# Altium schematic symbol library Capacitor - Ceramic - Sumsung.SchLib: 1421 symbols (part 4 of 8) (continued)
## CL21B103JBANNNC (continued)
CAP CER 10000PF 50V X7R 0805; Part Number: CL21B103JBANNNC; Manufacturer: Samsung Electro-Mechanics America, Inc.; TemperatureRange: -55C ~ 125C; Tolerance: 5%; Value: 10000pF; PartId: 14087; Supplier 1: Digi-Key; Supplier Part Number 1: 1276-1245-2-ND; ComponentLink1Description: Datasheet; ComponentLink1URL: http://www.samsungsem.com/kr/support/product-search/mlcc/CL21B103JBANNNC.jsp; ComponentLink2Description: Digi-Key Listing; ComponentLink2URL: https://www.digikey.com/product-detail/en/samsung-electro-mechanics-america-inc/CL21B103JBANNNC/1276-1245-2-ND/3886903; TemperatureCoefficient: X7R; Voltage: 50V; Price: 0.0151; Device Package: 0805 (2012 Metric)
footprint CAP 0805/2012
pins: 1, 2

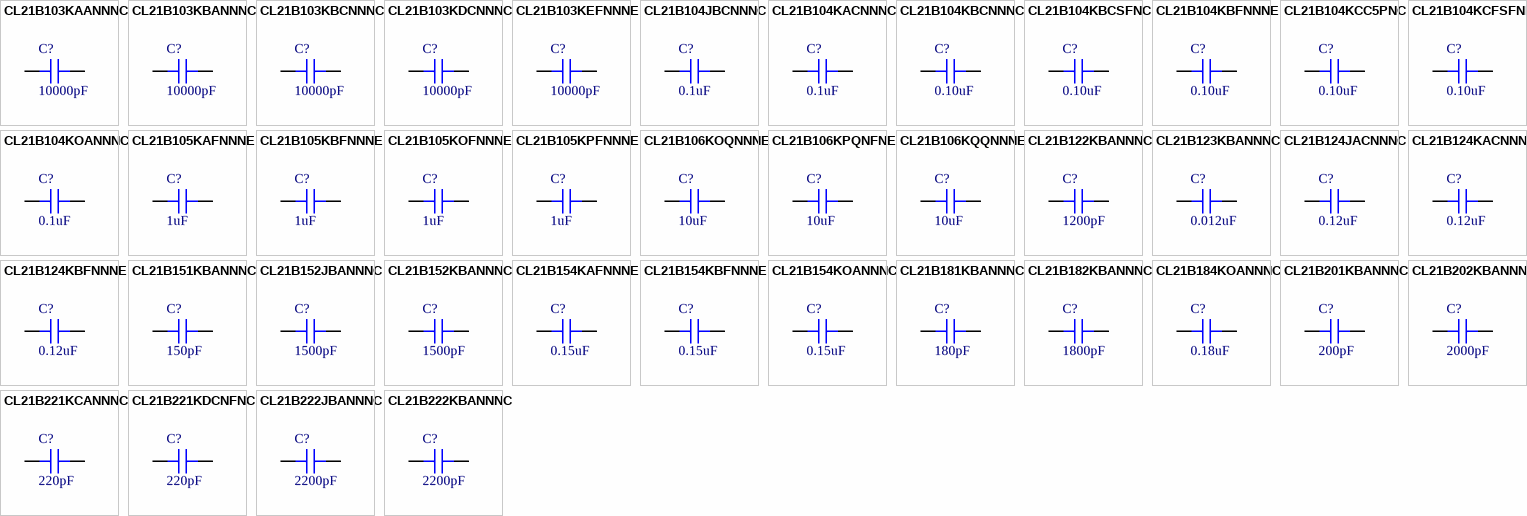
[diagram p18: symbols CL21B103KAANNNC to CL21B222KBANNNC]

## CL21B103KAANNNC
designator C?, comment 10000pF
CAP CER 10000PF 25V X7R 0805; Part Number: CL21B103KAANNNC; Manufacturer: Samsung Electro-Mechanics America, Inc.; TemperatureRange: -55C ~ 125C; Tolerance: 10%; Value: 10000pF; PartId: 5695; Supplier 1: Digi-Key; Supplier Part Number 1: 1276-2434-2-ND; ComponentLink1Description: Datasheet; ComponentLink1URL: http://www.samsungsem.com/kr/support/product-search/mlcc/CL21B103KAANNNC.jsp; ComponentLink2Description: Digi-Key listing; ComponentLink2URL: http://digikey.com/product-detail/en/CL21B103KAANNNC/1276-2434-2-ND/3888092; TemperatureCoefficient: X7R; Voltage: 25V; Price: 0.0081; Type: -; Device Package: 0805 (2012 Metric)
footprint CAP 0805/2012
pins: 1, 2

## CL21B103KBANNNC
designator C?, comment 10000pF
CAP CER 10000PF 50V X7R 0805; Part Number: CL21B103KBANNNC; Manufacturer: Samsung Electro-Mechanics America, Inc.; TemperatureRange: -55C ~ 125C; Tolerance: 10%; Value: 10000pF; PartId: 13759; Supplier 1: Digi-Key; Supplier Part Number 1: 1276-1015-2-ND; ComponentLink1Description: Datasheet; ComponentLink1URL: http://www.samsungsem.com/kr/support/product-search/mlcc/CL21B103KBANNNC.jsp; ComponentLink2Description: Digi-Key Listing; ComponentLink2URL: https://www.digikey.com/product-detail/en/samsung-electro-mechanics-america-inc/CL21B103KBANNNC/1276-1015-2-ND/3886673; TemperatureCoefficient: X7R; Voltage: 50V; Price: 0.0056; Device Package: 0805 (2012 Metric)
footprint CAP 0805/2012
pins: 1, 2

## CL21B103KBCNNNC
designator C?, comment 10000pF
CAP CER 10000PF 50V X7R 0805; Part Number: CL21B103KBCNNNC; Manufacturer: Samsung Electro-Mechanics America, Inc.; TemperatureRange: -55C ~ 125C; Tolerance: 10%; Value: 10000pF; PartId: 13919; Supplier 1: Digi-Key; Supplier Part Number 1: 1276-1078-2-ND; ComponentLink1Description: Datasheet; ComponentLink1URL: http://www.samsungsem.com/kr/support/product-search/mlcc/CL21B103KBCNNNC.jsp; ComponentLink2Description: Digi-Key Listing; ComponentLink2URL: https://www.digikey.com/product-detail/en/samsung-electro-mechanics-america-inc/CL21B103KBCNNNC/1276-1078-2-ND/3886736; TemperatureCoefficient: X7R; Voltage: 50V; Price: 0.0056; Device Package: 0805 (2012 Metric)
footprint CAP 0805/2012
pins: 1, 2

## CL21B103KDCNNNC
designator C?, comment 10000pF
CAP CER 10000PF 200V X7R 0805; Part Number: CL21B103KDCNNNC; Manufacturer: Samsung Electro-Mechanics America, Inc.; TemperatureRange: -55C ~ 125C; Tolerance: 10%; Value: 10000pF; PartId: 5868; Supplier 1: Digi-Key; Supplier Part Number 1: 1276-1170-2-ND; ComponentLink1Description: Datasheet; ComponentLink1URL: http://www.samsungsem.com/global/front/downloadcms.do?path=%2F%2Fglobal%2F%2Fsupport%2F%2Flibrary%2F%2Fproduct-catalog%2F%2F__icsFiles%2F%2Fafieldfile%2F%2F2015%2F%2F11%2F%2F18&fileName=MLCC_1.pdf; ComponentLink2Description: Digi-Key listing; ComponentLink2URL: http://digikey.com/product-detail/en/CL21B103KDCNNNC/1276-1170-2-ND/3886828; TemperatureCoefficient: X7R; Voltage: 200V; Price: 0.0286; Type: -; Device Package: 0805 (2012 Metric)
footprint CAP 0805/2012
pins: 1, 2

## CL21B103KEFNNNE
designator C?, comment 10000pF
CAP CER 10000PF 250V X7R 0805; Part Number: CL21B103KEFNNNE; Manufacturer: Samsung Electro-Mechanics America, Inc.; TemperatureRange: -55C ~ 125C; Tolerance: 10%; Value: 10000pF; PartId: 5912; Supplier 1: Digi-Key; Supplier Part Number 1: 1276-2921-2-ND; ComponentLink1Description: Datasheet; ComponentLink1URL: http://media.digikey.com/pdf/Data%20Sheets/Samsung%20PDFs/CL21B103KEFNNNE_Spec.pdf; ComponentLink2Description: Digi-Key listing; ComponentLink2URL: http://digikey.com/product-detail/en/CL21B103KEFNNNE/1276-2921-2-ND/3888579; TemperatureCoefficient: X7R; Voltage: 250V; Price: 0.0371; Type: -; Device Package: 0805 (2012 Metric)
footprint CAP 0805/2012
pins: 1, 2

## CL21B104JBCNNNC
designator C?, comment 0.1uF
CAP CER 0.1UF 50V X7R 0805; Part Number: CL21B104JBCNNNC; Manufacturer: Samsung Electro-Mechanics America, Inc.; TemperatureRange: -55C ~ 125C; Tolerance: 5%; Value: 0.1uF; PartId: 5847; Supplier 1: Digi-Key; Supplier Part Number 1: 1276-1090-2-ND; ComponentLink1Description: Datasheet; ComponentLink1URL: http://www.samsungsem.com/kr/support/product-search/mlcc/CL21B104JBCNNNC.jsp; ComponentLink2Description: Digi-Key listing; ComponentLink2URL: http://digikey.com/product-detail/en/CL21B104JBCNNNC/1276-1090-2-ND/3886748; TemperatureCoefficient: X7R; Voltage: 50V; Price: 0.0245; Type: -; Device Package: 0805 (2012 Metric)
footprint CAP 0805/2012
pins: 1, 2

## CL21B104KACNNNC
designator C?, comment 0.1uF
CAP CER 0.1UF 25V X7R 0805; Part Number: CL21B104KACNNNC; Manufacturer: Samsung Electro-Mechanics America, Inc.; TemperatureRange: -55C ~ 125C; Tolerance: 10%; Value: 0.1uF; PartId: 5699; Supplier 1: Digi-Key; Supplier Part Number 1: 1276-1099-2-ND; ComponentLink1Description: Datasheet; ComponentLink1URL: http://www.samsungsem.com/kr/support/product-search/mlcc/CL21B104KACNNNC.jsp; ComponentLink2Description: Digi-Key listing; ComponentLink2URL: http://digikey.com/product-detail/en/CL21B104KACNNNC/1276-1099-2-ND/3886757; TemperatureCoefficient: X7R; Voltage: 25V; Price: 0.0099; Type: -; Device Package: 0805 (2012 Metric)
footprint CAP 0805/2012
pins: 1, 2

## CL21B104KBCNNNC
designator C?, comment 0.10uF
CAP CER 0.1UF 50V X7R 0805; Part Number: CL21B104KBCNNNC; Manufacturer: Samsung Electro-Mechanics America, Inc.; TemperatureRange: -55C ~ 125C; Tolerance: 10%; Value: 0.10uF; PartId: 13700; Supplier 1: Digi-Key; Supplier Part Number 1: 1276-1003-2-ND; ComponentLink1Description: Datasheet; ComponentLink1URL: http://www.samsungsem.com/kr/support/product-search/mlcc/CL21B104KBCNNNC.jsp; ComponentLink2Description: Digi-Key Listing; ComponentLink2URL: https://www.digikey.com/product-detail/en/samsung-electro-mechanics-america-inc/CL21B104KBCNNNC/1276-1003-2-ND/3886661; TemperatureCoefficient: X7R; Voltage: 50V; Price: 0.0092; Device Package: 0805 (2012 Metric)
footprint CAP 0805/2012
pins: 1, 2

## CL21B104KBCSFNC
designator C?, comment 0.10uF
CAP CER 0.1UF 50V X7R 0805; Part Number: CL21B104KBCSFNC; Manufacturer: Samsung Electro-Mechanics America, Inc.; TemperatureRange: -55C ~ 125C; Tolerance: 10%; Value: 0.10uF; PartId: 13972; Supplier 1: Digi-Key; Supplier Part Number 1: 1276-2446-2-ND; ComponentLink1Description: Datasheet; ComponentLink1URL: http://www.samsungsem.com/kr/support/product-search/mlcc/CL21B104KBCSFNC.jsp; ComponentLink2Description: Digi-Key Listing; ComponentLink2URL: https://www.digikey.com/product-detail/en/samsung-electro-mechanics-america-inc/CL21B104KBCSFNC/1276-2446-2-ND/3888104; TemperatureCoefficient: X7R; Voltage: 50V; Price: 0.0097; Device Package: 0805 (2012 Metric)
footprint CAP 0805/2012
pins: 1, 2

## CL21B104KBFNNNE
designator C?, comment 0.10uF
CAP CER 0.1UF 50V X7R 0805; Part Number: CL21B104KBFNNNE; Manufacturer: Samsung Electro-Mechanics America, Inc.; TemperatureRange: -55C ~ 125C; Tolerance: 10%; Value: 0.10uF; PartId: 13810; Supplier 1: Digi-Key; Supplier Part Number 1: 1276-1180-2-ND; ComponentLink1Description: Datasheet; ComponentLink1URL: http://www.samsungsem.com/kr/support/product-search/mlcc/CL21B104KBFNNNE.jsp; ComponentLink2Description: Digi-Key Listing; ComponentLink2URL: https://www.digikey.com/product-detail/en/samsung-electro-mechanics-america-inc/CL21B104KBFNNNE/1276-1180-2-ND/3886838; TemperatureCoefficient: X7R; Voltage: 50V; Price: 0.0075; Device Package: 0805 (2012 Metric)
footprint CAP 0805/2012
pins: 1, 2

## CL21B104KCC5PNC
designator C?, comment 0.10uF
CAP CER 0.1UF 100V X7R 0805; Part Number: CL21B104KCC5PNC; Manufacturer: Samsung Electro-Mechanics America, Inc.; TemperatureRange: -55C ~ 125C; Tolerance: 10%; Value: 0.10uF; PartId: 14071; Supplier 1: Digi-Key; Supplier Part Number 1: 1276-2447-2-ND; ComponentLink1Description: Datasheet; ComponentLink1URL: //media.digikey.com/pdf/Data%20Sheets/Samsung%20PDFs/CL21B104KCC5PNC_Spec.pdf; ComponentLink2Description: Digi-Key Listing; ComponentLink2URL: https://www.digikey.com/product-detail/en/samsung-electro-mechanics-america-inc/CL21B104KCC5PNC/1276-2447-2-ND/3888105; TemperatureCoefficient: X7R; Voltage: 100V; Price: 0.0149; Device Package: 0805 (2012 Metric)
footprint CAP 0805/2012
pins: 1, 2

## CL21B104KCFSFNE
designator C?, comment 0.10uF
CAP CER 0.1UF 100V X7R 0805; Part Number: CL21B104KCFSFNE; Manufacturer: Samsung Electro-Mechanics America, Inc.; TemperatureRange: -55C ~ 125C; Tolerance: 10%; Value: 0.10uF; PartId: 13753; Supplier 1: Digi-Key; Supplier Part Number 1: 1276-2923-2-ND; ComponentLink1Description: Datasheet; ComponentLink1URL: //media.digikey.com/pdf/Data%20Sheets/Samsung%20PDFs/CL21B104KCFSFNE_Spec.pdf; ComponentLink2Description: Digi-Key Listing; ComponentLink2URL: https://www.digikey.com/product-detail/en/samsung-electro-mechanics-america-inc/CL21B104KCFSFNE/1276-2923-2-ND/3888581; TemperatureCoefficient: X7R; Voltage: 100V; Price: 0.029; Device Package: 0805 (2012 Metric)
footprint CAP 0805/2012
pins: 1, 2

## CL21B104KOANNNC
designator C?, comment 0.1uF
CAP CER 0.1UF 16V X7R 0805; Part Number: CL21B104KOANNNC; Manufacturer: Samsung Electro-Mechanics America, Inc.; TemperatureRange: -55C ~ 125C; Tolerance: 10%; Value: 0.1uF; PartId: 5700; Supplier 1: Digi-Key; Supplier Part Number 1: 1276-2448-2-ND; ComponentLink1Description: Datasheet; ComponentLink1URL: http://www.samsungsem.com/kr/support/product-search/mlcc/CL21B104KOANNNC.jsp; ComponentLink2Description: Digi-Key listing; ComponentLink2URL: http://digikey.com/product-detail/en/CL21B104KOANNNC/1276-2448-2-ND/3888106; TemperatureCoefficient: X7R; Voltage: 16V; Price: 0.0099; Type: -; Device Package: 0805 (2012 Metric)
footprint CAP 0805/2012
pins: 1, 2

## CL21B105KAFNNNE
designator C?, comment 1uF
CAP CER 1UF 25V X7R 0805; Part Number: CL21B105KAFNNNE; Manufacturer: Samsung Electro-Mechanics America, Inc.; TemperatureRange: -55C ~ 125C; Tolerance: 10%; Value: 1uF; PartId: 13769; Supplier 1: Digi-Key; Supplier Part Number 1: 1276-1066-2-ND; ComponentLink1Description: Datasheet; ComponentLink1URL: http://www.samsungsem.com/kr/support/product-search/mlcc/CL21B105KAFNNNE.jsp; ComponentLink2Description: Digi-Key Listing; ComponentLink2URL: https://www.digikey.com/product-detail/en/samsung-electro-mechanics-america-inc/CL21B105KAFNNNE/1276-1066-2-ND/3886724; TemperatureCoefficient: X7R; Voltage: 25V; Price: 0.0168; Device Package: 0805 (2012 Metric)
footprint CAP 0805/2012
pins: 1, 2

## CL21B105KBFNNNE
designator C?, comment 1uF
CAP CER 1UF 50V X7R 0805; Part Number: CL21B105KBFNNNE; Manufacturer: Samsung Electro-Mechanics America, Inc.; TemperatureRange: -55C ~ 125C; Tolerance: 10%; Value: 1uF; PartId: 13727; Supplier 1: Digi-Key; Supplier Part Number 1: 1276-1029-2-ND; ComponentLink1Description: Datasheet; ComponentLink1URL: http://www.samsungsem.com/kr/support/product-search/mlcc/CL21B105KBFNNNE.jsp; ComponentLink2Description: Digi-Key Listing; ComponentLink2URL: https://www.digikey.com/product-detail/en/samsung-electro-mechanics-america-inc/CL21B105KBFNNNE/1276-1029-2-ND/3886687; TemperatureCoefficient: X7R; Voltage: 50V; Price: 0.038; Device Package: 0805 (2012 Metric)
footprint CAP 0805/2012
pins: 1, 2

## CL21B105KOFNNNE
designator C?, comment 1uF
CAP CER 1UF 16V X7R 0805; Part Number: CL21B105KOFNNNE; Manufacturer: Samsung Electro-Mechanics America, Inc.; TemperatureRange: -55C ~ 125C; Tolerance: 10%; Value: 1uF; PartId: 13857; Supplier 1: Digi-Key; Supplier Part Number 1: 1276-1026-2-ND; ComponentLink1Description: Datasheet; ComponentLink1URL: http://www.samsungsem.com/kr/front/downloadcms.do?path=/kr/support/product-search/mlcc/__icsFiles/afieldfile/2014/11/05&fileName=C_CL21B105KOFNNNE.pdf; ComponentLink2Description: Digi-Key Listing; ComponentLink2URL: https://www.digikey.com/product-detail/en/samsung-electro-mechanics-america-inc/CL21B105KOFNNNE/1276-1026-2-ND/3886684; TemperatureCoefficient: X7R; Voltage: 16V; Price: 0.0137; Device Package: 0805 (2012 Metric)
footprint CAP 0805/2012
pins: 1, 2

## CL21B105KPFNNNE
designator C?, comment 1uF
CAP CER 1UF 10V X7R 0805; Part Number: CL21B105KPFNNNE; Manufacturer: Samsung Electro-Mechanics America, Inc.; TemperatureRange: -55C ~ 125C; Tolerance: 10%; Value: 1uF; PartId: 5813; Supplier 1: Digi-Key; Supplier Part Number 1: 1276-1275-2-ND; ComponentLink1Description: Datasheet; ComponentLink1URL: http://www.samsungsem.com/kr/support/product-search/mlcc/CL21B105KPFNNNE.jsp; ComponentLink2Description: Digi-Key listing; ComponentLink2URL: http://digikey.com/product-detail/en/CL21B105KPFNNNE/1276-1275-2-ND/3886933; TemperatureCoefficient: X7R; Voltage: 10V; Price: 0.0197; Type: -; Device Package: 0805 (2012 Metric)
footprint CAP 0805/2012
pins: 1, 2

## CL21B106KOQNNNE
designator C?, comment 10uF
CAP CER 10UF 16V X7R 0805; Part Number: CL21B106KOQNNNE; Manufacturer: Samsung Electro-Mechanics America, Inc.; TemperatureRange: -55C ~ 125C; Tolerance: 10%; Value: 10uF; PartId: 6056; Supplier 1: Digi-Key; Supplier Part Number 1: 1276-2872-2-ND; ComponentLink1Description: Datasheet; ComponentLink1URL: http://www.samsungsem.com/kr/support/product-search/mlcc/CL21B106KOQNNNE.jsp; ComponentLink2Description: Digi-Key listing; ComponentLink2URL: http://digikey.com/product-detail/en/CL21B106KOQNNNE/1276-2872-2-ND/3888530; TemperatureCoefficient: X7R; Voltage: 16V; Price: 0.0886; Type: -; Device Package: 0805 (2012 Metric)
footprint CAP 0805/2012
pins: 1, 2

## CL21B106KPQNFNE
designator C?, comment 10uF
CAP CER 10UF 10V X7R 0805; Part Number: CL21B106KPQNFNE; Manufacturer: Samsung Electro-Mechanics America, Inc.; TemperatureRange: -55C ~ 125C; Tolerance: 10%; Value: 10uF; PartId: 14141; Supplier 1: Digi-Key; Supplier Part Number 1: 1276-2934-2-ND; ComponentLink1Description: Datasheet; ComponentLink1URL: //media.digikey.com/pdf/Data%20Sheets/Samsung%20PDFs/CL21B106KPQNFNE_Spec.pdf; ComponentLink2Description: Digi-Key Listing; ComponentLink2URL: https://www.digikey.com/product-detail/en/samsung-electro-mechanics-america-inc/CL21B106KPQNFNE/1276-2934-2-ND/3888592; TemperatureCoefficient: X7R; Voltage: 10V; Price: 0.06; Device Package: 0805 (2012 Metric)
footprint CAP 0805/2012
pins: 1, 2

## CL21B106KQQNNNE
designator C?, comment 10uF
CAP CER 10UF 6.3V X7R 0805; Part Number: CL21B106KQQNNNE; Manufacturer: Samsung Electro-Mechanics America, Inc.; TemperatureRange: -55C ~ 125C; Tolerance: 10%; Value: 10uF; PartId: 14282; Supplier 1: Digi-Key; Supplier Part Number 1: 1276-1113-2-ND; ComponentLink1Description: Datasheet; ComponentLink1URL: http://www.samsungsem.com/kr/front/downloadcms.do?path=/kr/support/product-search/mlcc/__icsFiles/afieldfile/2014/11/05&fileName=C_CL21B106KQQNNNE.pdf; ComponentLink2Description: Digi-Key Listing; ComponentLink2URL: https://www.digikey.com/product-detail/en/samsung-electro-mechanics-america-inc/CL21B106KQQNNNE/1276-1113-2-ND/3886771; TemperatureCoefficient: X7R; Voltage: 6.3V; Price: 0.0488; Device Package: 0805 (2012 Metric)
footprint CAP 0805/2012
pins: 1, 2

## CL21B122KBANNNC
designator C?, comment 1200pF
CAP CER 1200PF 50V X7R 0805; Part Number: CL21B122KBANNNC; Manufacturer: Samsung Electro-Mechanics America, Inc.; TemperatureRange: -55C ~ 125C; Tolerance: 10%; Value: 1200pF; PartId: 5743; Supplier 1: Digi-Key; Supplier Part Number 1: 1276-2453-2-ND; ComponentLink1Description: Datasheet; ComponentLink1URL: http://media.digikey.com/pdf/Data%20Sheets/Samsung%20PDFs/CL21B122KBANNNC_Spec.pdf; ComponentLink2Description: Digi-Key listing; ComponentLink2URL: http://digikey.com/product-detail/en/CL21B122KBANNNC/1276-2453-2-ND/3888111; TemperatureCoefficient: X7R; Voltage: 50V; Price: 0.0153; Type: -; Device Package: 0805 (2012 Metric)
footprint CAP 0805/2012
pins: 1, 2

## CL21B123KBANNNC
designator C?, comment 0.012uF
CAP CER 0.012UF 50V X7R 0805; Part Number: CL21B123KBANNNC; Manufacturer: Samsung Electro-Mechanics America, Inc.; TemperatureRange: -55C ~ 125C; Tolerance: 10%; Value: 0.012uF; PartId: 5822; Supplier 1: Digi-Key; Supplier Part Number 1: 1276-2454-2-ND; ComponentLink1Description: Datasheet; ComponentLink1URL: http://media.digikey.com/pdf/Data%20Sheets/Samsung%20PDFs/CL21B123KBANNNC_Spec.pdf; ComponentLink2Description: Digi-Key listing; ComponentLink2URL: http://digikey.com/product-detail/en/CL21B123KBANNNC/1276-2454-2-ND/3888112; TemperatureCoefficient: X7R; Voltage: 50V; Price: 0.0214; Type: -; Device Package: 0805 (2012 Metric)
footprint CAP 0805/2012
pins: 1, 2

## CL21B124JACNNNC
designator C?, comment 0.12uF
CAP CER 0.12UF 25V X7R 0805; Part Number: CL21B124JACNNNC; Manufacturer: Samsung Electro-Mechanics America, Inc.; TemperatureRange: -55C ~ 125C; Tolerance: 5%; Value: 0.12uF; PartId: 5837; Supplier 1: Digi-Key; Supplier Part Number 1: 1276-2455-2-ND; ComponentLink1Description: Datasheet; ComponentLink1URL: http://media.digikey.com/pdf/Data%20Sheets/Samsung%20PDFs/CL21B124JACNNNC_Spec.pdf; ComponentLink2Description: Digi-Key listing; ComponentLink2URL: http://digikey.com/product-detail/en/CL21B124JACNNNC/1276-2455-2-ND/3888113; TemperatureCoefficient: X7R; Voltage: 25V; Price: 0.0235; Type: -; Device Package: 0805 (2012 Metric)
footprint CAP 0805/2012
pins: 1, 2

## CL21B124KACNNNC
designator C?, comment 0.12uF
CAP CER 0.12UF 25V X7R 0805; Part Number: CL21B124KACNNNC; Manufacturer: Samsung Electro-Mechanics America, Inc.; TemperatureRange: -55C ~ 125C; Tolerance: 10%; Value: 0.12uF; PartId: 5909; Supplier 1: Digi-Key; Supplier Part Number 1: 1276-2456-2-ND; ComponentLink1Description: Datasheet; ComponentLink1URL: http://media.digikey.com/pdf/Data%20Sheets/Samsung%20PDFs/CL21B124KACNNNC_Spec.pdf; ComponentLink2Description: Digi-Key listing; ComponentLink2URL: http://digikey.com/product-detail/en/CL21B124KACNNNC/1276-2456-2-ND/3888114; TemperatureCoefficient: X7R; Voltage: 25V; Price: 0.0362; Type: -; Device Package: 0805 (2012 Metric)
footprint CAP 0805/2012
pins: 1, 2

## CL21B124KBFNNNE
designator C?, comment 0.12uF
CAP CER 0.12UF 50V X7R 0805; Part Number: CL21B124KBFNNNE; Manufacturer: Samsung Electro-Mechanics America, Inc.; TemperatureRange: -55C ~ 125C; Tolerance: 10%; Value: 0.12uF; PartId: 5927; Supplier 1: Digi-Key; Supplier Part Number 1: 1276-2936-2-ND; ComponentLink1Description: Datasheet; ComponentLink1URL: http://media.digikey.com/pdf/Data%20Sheets/Samsung%20PDFs/CL21B124KBFNNNE_Spec.pdf; ComponentLink2Description: Digi-Key listing; ComponentLink2URL: http://digikey.com/product-detail/en/CL21B124KBFNNNE/1276-2936-2-ND/3888594; TemperatureCoefficient: X7R; Voltage: 50V; Price: 0.0417; Type: -; Device Package: 0805 (2012 Metric)
footprint CAP 0805/2012
pins: 1, 2

## CL21B151KBANNNC
designator C?, comment 150pF
CAP CER 150PF 50V X7R 0805; Part Number: CL21B151KBANNNC; Manufacturer: Samsung Electro-Mechanics America, Inc.; TemperatureRange: -55C ~ 125C; Tolerance: 10%; Value: 150pF; PartId: 5786; Supplier 1: Digi-Key; Supplier Part Number 1: 1276-2457-2-ND; ComponentLink1Description: Datasheet; ComponentLink1URL: http://media.digikey.com/pdf/Data%20Sheets/Samsung%20PDFs/CL21B151KBANNNC_character.pdf; ComponentLink2Description: Digi-Key listing; ComponentLink2URL: http://digikey.com/product-detail/en/CL21B151KBANNNC/1276-2457-2-ND/3888115; TemperatureCoefficient: X7R; Voltage: 50V; Price: 0.0173; Type: -; Device Package: 0805 (2012 Metric)
footprint CAP 0805/2012
pins: 1, 2

## CL21B152JBANNNC
designator C?, comment 1500pF
CAP CER 1500PF 50V X7R 0805; Part Number: CL21B152JBANNNC; Manufacturer: Samsung Electro-Mechanics America, Inc.; TemperatureRange: -55C ~ 125C; Tolerance: 5%; Value: 1500pF; PartId: 5861; Supplier 1: Digi-Key; Supplier Part Number 1: 1276-2458-2-ND; ComponentLink1Description: Datasheet; ComponentLink1URL: http://www.samsungsem.com/kr/front/downloadcms.do?path=/kr/support/product-search/mlcc/__icsFiles/afieldfile/2014/11/05&fileName=C_CL21B152JBANNNC.pdf; ComponentLink2Description: Digi-Key listing; ComponentLink2URL: http://digikey.com/product-detail/en/CL21B152JBANNNC/1276-2458-2-ND/3888116; TemperatureCoefficient: X7R; Voltage: 50V; Price: 0.0275; Type: -; Device Package: 0805 (2012 Metric)
footprint CAP 0805/2012
pins: 1, 2

## CL21B152KBANNNC
designator C?, comment 1500pF
CAP CER 1500PF 50V X7R 0805; Part Number: CL21B152KBANNNC; Manufacturer: Samsung Electro-Mechanics America, Inc.; TemperatureRange: -55C ~ 125C; Tolerance: 10%; Value: 1500pF; PartId: 5734; Supplier 1: Digi-Key; Supplier Part Number 1: 1276-1794-2-ND; ComponentLink1Description: Datasheet; ComponentLink1URL: http://www.samsungsem.com/kr/front/downloadcms.do?path=/kr/support/product-search/mlcc/__icsFiles/afieldfile/2014/11/05&fileName=C_CL21B152KBANNNC.pdf; ComponentLink2Description: Digi-Key listing; ComponentLink2URL: http://digikey.com/product-detail/en/CL21B152KBANNNC/1276-1794-2-ND/3887452; TemperatureCoefficient: X7R; Voltage: 50V; Price: 0.015; Type: -; Device Package: 0805 (2012 Metric)
footprint CAP 0805/2012
pins: 1, 2

## CL21B154KAFNNNE
designator C?, comment 0.15uF
CAP CER 0.15UF 25V X7R 0805; Part Number: CL21B154KAFNNNE; Manufacturer: Samsung Electro-Mechanics America, Inc.; TemperatureRange: -55C ~ 125C; Tolerance: 10%; Value: 0.15uF; PartId: 5892; Supplier 1: Digi-Key; Supplier Part Number 1: 1276-2937-2-ND; ComponentLink1Description: Datasheet; ComponentLink1URL: http://media.digikey.com/pdf/Data%20Sheets/Samsung%20PDFs/CL21B154KAFNNNE_Spec.pdf; ComponentLink2Description: Digi-Key listing; ComponentLink2URL: http://digikey.com/product-detail/en/CL21B154KAFNNNE/1276-2937-2-ND/3888595; TemperatureCoefficient: X7R; Voltage: 25V; Price: 0.0337; Type: -; Device Package: 0805 (2012 Metric)
footprint CAP 0805/2012
pins: 1, 2

## CL21B154KBFNNNE
designator C?, comment 0.15uF
CAP CER 0.15UF 50V X7R 0805; Part Number: CL21B154KBFNNNE; Manufacturer: Samsung Electro-Mechanics America, Inc.; TemperatureRange: -55C ~ 125C; Tolerance: 10%; Value: 0.15uF; PartId: 13832; Supplier 1: Digi-Key; Supplier Part Number 1: 1276-1299-2-ND; ComponentLink1Description: Datasheet; ComponentLink1URL: http://www.samsungsem.com/kr/front/downloadcms.do?path=/kr/support/product-search/mlcc/__icsFiles/afieldfile/2014/11/05&fileName=C_CL21B154KBFNNNE.pdf; ComponentLink2Description: Digi-Key Listing; ComponentLink2URL: https://www.digikey.com/product-detail/en/samsung-electro-mechanics-america-inc/CL21B154KBFNNNE/1276-1299-2-ND/3886957; TemperatureCoefficient: X7R; Voltage: 50V; Price: 0.0235; Device Package: 0805 (2012 Metric)
footprint CAP 0805/2012
pins: 1, 2

## CL21B154KOANNNC
designator C?, comment 0.15uF
CAP CER 0.15UF 16V X7R 0805; Part Number: CL21B154KOANNNC; Manufacturer: Samsung Electro-Mechanics America, Inc.; TemperatureRange: -55C ~ 125C; Tolerance: 10%; Value: 0.15uF; PartId: 5879; Supplier 1: Digi-Key; Supplier Part Number 1: 1276-2463-2-ND; ComponentLink1Description: Datasheet; ComponentLink1URL: http://media.digikey.com/pdf/Data%20Sheets/Samsung%20PDFs/CL21B154KOANNNC_Spec.pdf; ComponentLink2Description: Digi-Key listing; ComponentLink2URL: http://digikey.com/product-detail/en/CL21B154KOANNNC/1276-2463-2-ND/3888121; TemperatureCoefficient: X7R; Voltage: 16V; Price: 0.0308; Type: -; Device Package: 0805 (2012 Metric)
footprint CAP 0805/2012
pins: 1, 2

## CL21B181KBANNNC
designator C?, comment 180pF
CAP CER 180PF 50V X7R 0805; Part Number: CL21B181KBANNNC; Manufacturer: Samsung Electro-Mechanics America, Inc.; TemperatureRange: -55C ~ 125C; Tolerance: 10%; Value: 180pF; PartId: 5667; Supplier 1: Digi-Key; Supplier Part Number 1: 1276-2464-2-ND; ComponentLink1Description: Datasheet; ComponentLink1URL: http://media.digikey.com/pdf/Data%20Sheets/Samsung%20PDFs/CL21B181KBANNNC_character.pdf; ComponentLink2Description: Digi-Key listing; ComponentLink2URL: http://digikey.com/product-detail/en/CL21B181KBANNNC/1276-2464-2-ND/3888122; TemperatureCoefficient: X7R; Voltage: 50V; Price: 0.0051; Type: -; Device Package: 0805 (2012 Metric)
footprint CAP 0805/2012
pins: 1, 2

## CL21B182KBANNNC
designator C?, comment 1800pF
CAP CER 1800PF 50V X7R 0805; Part Number: CL21B182KBANNNC; Manufacturer: Samsung Electro-Mechanics America, Inc.; TemperatureRange: -55C ~ 125C; Tolerance: 10%; Value: 1800pF; PartId: 5741; Supplier 1: Digi-Key; Supplier Part Number 1: 1276-2465-2-ND; ComponentLink1Description: Datasheet; ComponentLink1URL: http://media.digikey.com/pdf/Data%20Sheets/Samsung%20PDFs/CL21B182KBANNNC_Spec.pdf; ComponentLink2Description: Digi-Key listing; ComponentLink2URL: http://digikey.com/product-detail/en/CL21B182KBANNNC/1276-2465-2-ND/3888123; TemperatureCoefficient: X7R; Voltage: 50V; Price: 0.0153; Type: -; Device Package: 0805 (2012 Metric)
footprint CAP 0805/2012
pins: 1, 2

## CL21B184KOANNNC
designator C?, comment 0.18uF
CAP CER 0.18UF 16V X7R 0805; Part Number: CL21B184KOANNNC; Manufacturer: Samsung Electro-Mechanics America, Inc.; TemperatureRange: -55C ~ 125C; Tolerance: 10%; Value: 0.18uF; PartId: 5901; Supplier 1: Digi-Key; Supplier Part Number 1: 1276-2469-2-ND; ComponentLink1Description: Datasheet; ComponentLink1URL: http://media.digikey.com/pdf/Data%20Sheets/Samsung%20PDFs/CL21B184KOANNNC_character.pdf; ComponentLink2Description: Digi-Key listing; ComponentLink2URL: http://digikey.com/product-detail/en/CL21B184KOANNNC/1276-2469-2-ND/3888127; TemperatureCoefficient: X7R; Voltage: 16V; Price: 0.0351; Type: -; Device Package: 0805 (2012 Metric)
footprint CAP 0805/2012
pins: 1, 2

## CL21B201KBANNNC
designator C?, comment 200pF
CAP CER 200PF 50V X7R 0805; Part Number: CL21B201KBANNNC; Manufacturer: Samsung Electro-Mechanics America, Inc.; TemperatureRange: -55C ~ 125C; Tolerance: 10%; Value: 200pF; PartId: 5681; Supplier 1: Digi-Key; Supplier Part Number 1: 1276-2470-2-ND; ComponentLink1Description: Datasheet; ComponentLink1URL: http://www.samsungsem.com/kr/support/product-search/mlcc/CL21B201KBANNNC.jsp; ComponentLink2Description: Digi-Key listing; ComponentLink2URL: http://digikey.com/product-detail/en/CL21B201KBANNNC/1276-2470-2-ND/3888128; TemperatureCoefficient: X7R; Voltage: 50V; Price: 0.0059; Type: -; Device Package: 0805 (2012 Metric)
footprint CAP 0805/2012
pins: 1, 2

## CL21B202KBANNNC
designator C?, comment 2000pF
CAP CER 2000PF 50V X7R 0805; Part Number: CL21B202KBANNNC; Manufacturer: Samsung Electro-Mechanics America, Inc.; TemperatureRange: -55C ~ 125C; Tolerance: 10%; Value: 2000pF; PartId: 5740; Supplier 1: Digi-Key; Supplier Part Number 1: 1276-2471-2-ND; ComponentLink1Description: Datasheet; ComponentLink1URL: http://www.samsungsem.com/kr/support/product-search/mlcc/CL21B202KBANNNC.jsp; ComponentLink2Description: Digi-Key listing; ComponentLink2URL: http://digikey.com/product-detail/en/CL21B202KBANNNC/1276-2471-2-ND/3888129; TemperatureCoefficient: X7R; Voltage: 50V; Price: 0.0153; Type: -; Device Package: 0805 (2012 Metric)
footprint CAP 0805/2012
pins: 1, 2

## CL21B221KCANNNC
designator C?, comment 220pF
CAP CER 220PF 100V X7R 0805; Part Number: CL21B221KCANNNC; Manufacturer: Samsung Electro-Mechanics America, Inc.; TemperatureRange: -55C ~ 125C; Tolerance: 10%; Value: 220pF; PartId: 5845; Supplier 1: Digi-Key; Supplier Part Number 1: 1276-2476-2-ND; ComponentLink1Description: Datasheet; ComponentLink1URL: http://media.digikey.com/pdf/Data%20Sheets/Samsung%20PDFs/CL21B221KCANNNC_Spec.pdf; ComponentLink2Description: Digi-Key listing; ComponentLink2URL: http://digikey.com/product-detail/en/CL21B221KCANNNC/1276-2476-2-ND/3888134; TemperatureCoefficient: X7R; Voltage: 100V; Price: 0.0244; Type: -; Device Package: 0805 (2012 Metric)
footprint CAP 0805/2012
pins: 1, 2

## CL21B221KDCNFNC
designator C?, comment 220pF
CAP CER 220PF 200V X7R 0805; Part Number: CL21B221KDCNFNC; Manufacturer: Samsung Electro-Mechanics America, Inc.; TemperatureRange: -55C ~ 125C; Tolerance: 10%; Value: 220pF; PartId: 5810; Supplier 1: Digi-Key; Supplier Part Number 1: 1276-2477-2-ND; ComponentLink1Description: Datasheet; ComponentLink1URL: http://media.digikey.com/pdf/Data%20Sheets/Samsung%20PDFs/CL21B221KDCNFNC_Spec.pdf; ComponentLink2Description: Digi-Key listing; ComponentLink2URL: http://digikey.com/product-detail/en/CL21B221KDCNFNC/1276-2477-2-ND/3888135; TemperatureCoefficient: X7R; Voltage: 200V; Price: 0.0194; Type: -; Device Package: 0805 (2012 Metric)
footprint CAP 0805/2012
pins: 1, 2

## CL21B222JBANNNC
designator C?, comment 2200pF
CAP CER 2200PF 50V X7R 0805; Part Number: CL21B222JBANNNC; Manufacturer: Samsung Electro-Mechanics America, Inc.; TemperatureRange: -55C ~ 125C; Tolerance: 5%; Value: 2200pF; PartId: 5857; Supplier 1: Digi-Key; Supplier Part Number 1: 1276-2478-2-ND; ComponentLink1Description: Datasheet; ComponentLink1URL: http://www.samsungsem.com/kr/support/product-search/mlcc/CL21B222JBANNNC.jsp; ComponentLink2Description: Digi-Key listing; ComponentLink2URL: http://digikey.com/product-detail/en/CL21B222JBANNNC/1276-2478-2-ND/3888136; TemperatureCoefficient: X7R; Voltage: 50V; Price: 0.0263; Type: -; Device Package: 0805 (2012 Metric)
footprint CAP 0805/2012
pins: 1, 2

## CL21B222KBANNNC
designator C?, comment 2200pF
CAP CER 2200PF 50V X7R 0805; Part Number: CL21B222KBANNNC; Manufacturer: Samsung Electro-Mechanics America, Inc.; TemperatureRange: -55C ~ 125C; Tolerance: 10%; Value: 2200pF; PartId: 13843; Supplier 1: Digi-Key; Supplier Part Number 1: 1276-1171-2-ND; ComponentLink1Description: Datasheet; ComponentLink1URL: http://www.samsungsem.com/kr/support/product-search/mlcc/CL21B222KBANNNC.jsp; ComponentLink2Description: Digi-Key Listing; ComponentLink2URL: https://www.digikey.com/product-detail/en/samsung-electro-mechanics-america-inc/CL21B222KBANNNC/1276-1171-2-ND/3886829; TemperatureCoefficient: X7R; Voltage: 50V; Price: 0.0078; Device Package: 0805 (2012 Metric)
footprint CAP 0805/2012
pins: 1, 2

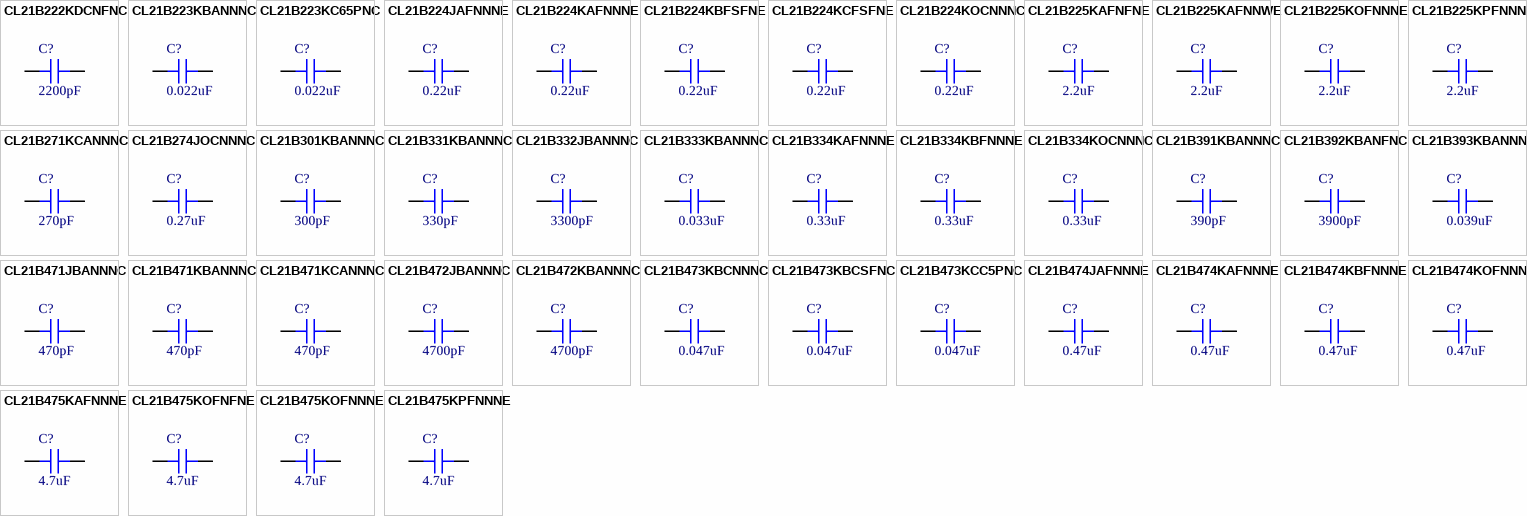
[diagram p19: symbols CL21B222KDCNFNC to CL21B475KPFNNNE]

## CL21B222KDCNFNC
designator C?, comment 2200pF
CAP CER 2200PF 200V X7R 0805; Part Number: CL21B222KDCNFNC; Manufacturer: Samsung Electro-Mechanics America, Inc.; TemperatureRange: -55C ~ 125C; Tolerance: 10%; Value: 2200pF; PartId: 5757; Supplier 1: Digi-Key; Supplier Part Number 1: 1276-2484-2-ND; ComponentLink1Description: Datasheet; ComponentLink1URL: http://media.digikey.com/pdf/Data%20Sheets/Samsung%20PDFs/CL21B222KDCNFNC_Spec.pdf; ComponentLink2Description: Digi-Key listing; ComponentLink2URL: http://digikey.com/product-detail/en/CL21B222KDCNFNC/1276-2484-2-ND/3888142; TemperatureCoefficient: X7R; Voltage: 200V; Price: 0.0163; Type: -; Device Package: 0805 (2012 Metric)
footprint CAP 0805/2012
pins: 1, 2

## CL21B223KBANNNC
designator C?, comment 0.022uF
CAP CER 0.022UF 50V X7R 0805; Part Number: CL21B223KBANNNC; Manufacturer: Samsung Electro-Mechanics America, Inc.; TemperatureRange: -55C ~ 125C; Tolerance: 10%; Value: 0.022uF; PartId: 13931; Supplier 1: Digi-Key; Supplier Part Number 1: 1276-1081-2-ND; ComponentLink1Description: Datasheet; ComponentLink1URL: http://www.samsungsem.com/kr/support/product-search/mlcc/CL21B223KBANNNC.jsp; ComponentLink2Description: Digi-Key Listing; ComponentLink2URL: https://www.digikey.com/product-detail/en/samsung-electro-mechanics-america-inc/CL21B223KBANNNC/1276-1081-2-ND/3886739; TemperatureCoefficient: X7R; Voltage: 50V; Price: 0.0121; Device Package: 0805 (2012 Metric)
footprint CAP 0805/2012
pins: 1, 2

## CL21B223KC65PNC
designator C?, comment 0.022uF
CAP CER 0.022UF 100V X7R 0805; Part Number: CL21B223KC65PNC; Manufacturer: Samsung Electro-Mechanics America, Inc.; TemperatureRange: -55C ~ 125C; Tolerance: 10%; Value: 0.022uF; PartId: 13867; Supplier 1: Digi-Key; Supplier Part Number 1: 1276-2491-2-ND; ComponentLink1Description: Datasheet; ComponentLink1URL: //media.digikey.com/pdf/Data%20Sheets/Samsung%20PDFs/CL21B223KC65PNC_Spec.pdf; ComponentLink2Description: Digi-Key Listing; ComponentLink2URL: https://www.digikey.com/product-detail/en/samsung-electro-mechanics-america-inc/CL21B223KC65PNC/1276-2491-2-ND/3888149; TemperatureCoefficient: X7R; Voltage: 100V; Price: 0.0119; Device Package: 0805 (2012 Metric)
footprint CAP 0805/2012
pins: 1, 2

## CL21B224JAFNNNE
designator C?, comment 0.22uF
CAP CER 0.22UF 25V X7R 0805; Part Number: CL21B224JAFNNNE; Manufacturer: Samsung Electro-Mechanics America, Inc.; TemperatureRange: -55C ~ 125C; Tolerance: 5%; Value: 0.22uF; PartId: 6051; Supplier 1: Digi-Key; Supplier Part Number 1: 1276-2943-2-ND; ComponentLink1Description: Datasheet; ComponentLink1URL: http://www.samsungsem.com/kr/support/product-search/mlcc/CL21B224JAFNNNE.jsp; ComponentLink2Description: Digi-Key listing; ComponentLink2URL: http://digikey.com/product-detail/en/CL21B224JAFNNNE/1276-2943-2-ND/3888601; TemperatureCoefficient: X7R; Voltage: 25V; Price: 0.0831; Type: -; Device Package: 0805 (2012 Metric)
footprint CAP 0805/2012
pins: 1, 2

## CL21B224KAFNNNE
designator C?, comment 0.22uF
CAP CER 0.22UF 25V X7R 0805; Part Number: CL21B224KAFNNNE; Manufacturer: Samsung Electro-Mechanics America, Inc.; TemperatureRange: -55C ~ 125C; Tolerance: 10%; Value: 0.22uF; PartId: 5865; Supplier 1: Digi-Key; Supplier Part Number 1: 1276-1161-2-ND; ComponentLink1Description: Datasheet; ComponentLink1URL: http://www.samsungsem.com/kr/support/product-search/mlcc/CL21B224KAFNNNE.jsp; ComponentLink2Description: Digi-Key listing; ComponentLink2URL: http://digikey.com/product-detail/en/CL21B224KAFNNNE/1276-1161-2-ND/3886819; TemperatureCoefficient: X7R; Voltage: 25V; Price: 0.028; Type: -; Device Package: 0805 (2012 Metric)
footprint CAP 0805/2012
pins: 1, 2

## CL21B224KBFSFNE
designator C?, comment 0.22uF
CAP CER 0.22UF 50V X7R 0805; Part Number: CL21B224KBFSFNE; Manufacturer: Samsung Electro-Mechanics America, Inc.; TemperatureRange: -55C ~ 125C; Tolerance: 10%; Value: 0.22uF; PartId: 13765; Supplier 1: Digi-Key; Supplier Part Number 1: 1276-2948-2-ND; ComponentLink1Description: Datasheet; ComponentLink1URL: //media.digikey.com/pdf/Data%20Sheets/Samsung%20PDFs/CL21B224KBFSFNE_Spec.pdf; ComponentLink2Description: Digi-Key Listing; ComponentLink2URL: https://www.digikey.com/product-detail/en/samsung-electro-mechanics-america-inc/CL21B224KBFSFNE/1276-2948-2-ND/3888606; TemperatureCoefficient: X7R; Voltage: 50V; Price: 0.0195; Device Package: 0805 (2012 Metric)
footprint CAP 0805/2012
pins: 1, 2

## CL21B224KCFSFNE
designator C?, comment 0.22uF
CAP CER 0.22UF 100V X7R 0805; Part Number: CL21B224KCFSFNE; Manufacturer: Samsung Electro-Mechanics America, Inc.; TemperatureRange: -55C ~ 125C; Tolerance: 10%; Value: 0.22uF; PartId: 6023; Supplier 1: Digi-Key; Supplier Part Number 1: 1276-2949-2-ND; ComponentLink1Description: Datasheet; ComponentLink1URL: http://media.digikey.com/pdf/Data%20Sheets/Samsung%20PDFs/CL21B224KCFSFNE_Spec.pdf; ComponentLink2Description: Digi-Key listing; ComponentLink2URL: http://digikey.com/product-detail/en/CL21B224KCFSFNE/1276-2949-2-ND/3888607; TemperatureCoefficient: X7R; Voltage: 100V; Price: 0.0736; Type: -; Device Package: 0805 (2012 Metric)
footprint CAP 0805/2012
pins: 1, 2

## CL21B224KOCNNNC
designator C?, comment 0.22uF
CAP CER 0.22UF 16V X7R 0805; Part Number: CL21B224KOCNNNC; Manufacturer: Samsung Electro-Mechanics America, Inc.; TemperatureRange: -55C ~ 125C; Tolerance: 10%; Value: 0.22uF; PartId: 5855; Supplier 1: Digi-Key; Supplier Part Number 1: 1276-1284-2-ND; ComponentLink1Description: Datasheet; ComponentLink1URL: http://www.samsungsem.com/kr/support/product-search/mlcc/CL21B224KOCNNNC.jsp; ComponentLink2Description: Digi-Key listing; ComponentLink2URL: http://digikey.com/product-detail/en/CL21B224KOCNNNC/1276-1284-2-ND/3886942; TemperatureCoefficient: X7R; Voltage: 16V; Price: 0.0256; Type: -; Device Package: 0805 (2012 Metric)
footprint CAP 0805/2012
pins: 1, 2

## CL21B225KAFNFNE
designator C?, comment 2.2uF
CAP CER 2.2UF 25V X7R 0805; Part Number: CL21B225KAFNFNE; Manufacturer: Samsung Electro-Mechanics America, Inc.; TemperatureRange: -55C ~ 125C; Tolerance: 10%; Value: 2.2uF; PartId: 14062; Supplier 1: Digi-Key; Supplier Part Number 1: 1276-2953-2-ND; ComponentLink1Description: Datasheet; ComponentLink1URL: //media.digikey.com/pdf/Data%20Sheets/Samsung%20PDFs/CL21B225KAFNFNE_Spec.pdf; ComponentLink2Description: Digi-Key Listing; ComponentLink2URL: https://www.digikey.com/product-detail/en/samsung-electro-mechanics-america-inc/CL21B225KAFNFNE/1276-2953-2-ND/3888611; TemperatureCoefficient: X7R; Voltage: 25V; Price: 0.0374; Device Package: 0805 (2012 Metric)
footprint CAP 0805/2012
pins: 1, 2